# Altium footprint library Misc.PCBLIB: 128 footprints (part 8 of 8)
Each footprint in its own frame and in the unit in brackets; x right, y up, seen from the top. Pads: shape width x height; smd on the part's side, far side on the other; paste and mask are expansions set on the pad; w line width, h text height; cw(c..) or ccw(c..) is an arc to the next point about the centre after c.
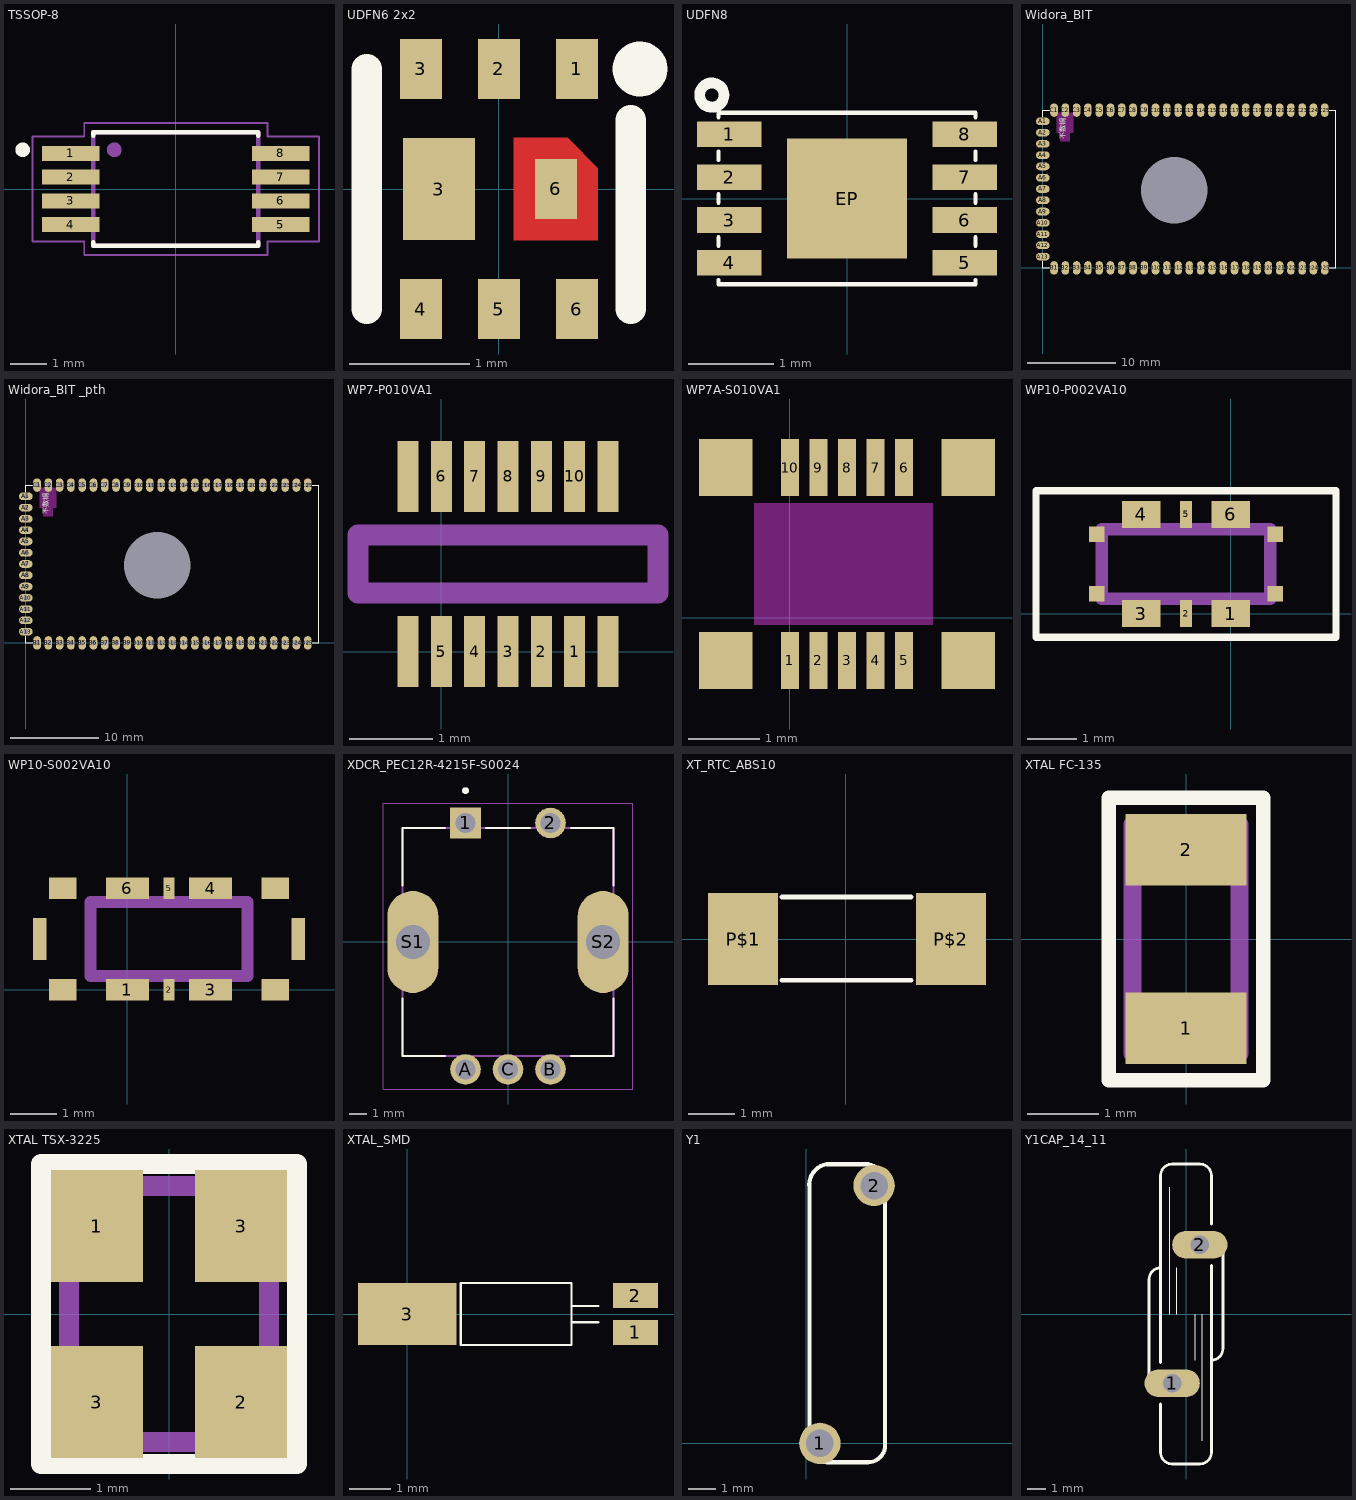
[diagram p7: the footprints below, top view; thin cyan lines are the x and y axes]

## TSSOP-8 [mm]
pads (8):
  rect 1.57x0.41 smd: 1(-2.87,0.975) 2(-2.87,0.325) 3(-2.87,-0.325) 4(-2.87,-0.975) 5(2.87,-0.975) 6(2.87,-0.325) 7(2.87,0.325) 8(2.87,0.975)
Top Overlay:
  circle w0.2: c-4.18,1.07 r0.1
  lines w0.127: -2.25,-1.45 -2.25,-1.55 2.25,-1.55 2.25,-1.45 ; -2.25,1.45 -2.25,1.55 2.25,1.55 2.25,1.45
Mechanical 1:
  circle w0.2: c-1.68,1.07 r0.1
  lines w0.127: -2.25,-1.55 -2.25,1.55 2.25,1.55 2.25,-1.55 -2.25,-1.55
Mechanical 4:
  lines w0.05: -3.91,-1.43 -3.91,1.43 -2.5,1.43 -2.5,1.8 2.5,1.8 2.5,1.43 3.91,1.43 3.91,-1.43 2.5,-1.43 2.5,-1.8 -2.5,-1.8 -2.5,-1.43 -3.91,-1.43
3D body "SW3dPS-TSSOP8-2.STEP": height 0.28, standoff -0.47, extent -1.5,-1 1.6,1

## UDFN6 2x2 [mm] "UDFN6 2x2, 0.65P  CASE 517BF"
height 0.55
pads (8):
  rect 0.35x0.5 smd: 1(0.65,1) 2(0,1) 3(-0.65,1) 4(-0.65,-1) 5(0,-1) 6(0.475,0.001) 6(0.65,-1)
  rect 0.6x0.85 smd: 3(-0.5,0)
Top Layer:
  region: 0.575,0.425 0.825,0.175 0.825,-0.425 0.125,-0.425 0.125,0.425
Top Overlay:
  circle w0.305: c1.175,1 r0.076
  lines w0.254: -1.1,-1 -1.1,1 ; 1.1,-1 1.1,0.575
Top Solder:
  region: 0.6,0.55 0.925,0.225 0.925,-0.525 0.025,-0.525 0.025,0.55
3D body: height 0.55, standoff 0, extent -1,-1 1,1

## UDFN8 [mil] "UDFN8 2x3, 0.65P  CASE 517BF"
height 21.65
pads (9):
  rect 29.53x11.81 smd: 1(-54.13,29.53) 2(-54.13,9.84) 3(-54.13,-9.84) 4(-54.13,-29.53) 5(54.13,-29.53) 6(54.13,-9.84) 7(54.13,9.84) 8(54.13,29.53)
  rect 55.12x55.12 smd: EP(0,0)
Top Overlay:
  circle w5: c-62.09,47.54 r5.57
  lines w1.97: -59.06,-37.4 -59.06,-39.37 59.06,-39.37 59.06,-37.4 ; -59.06,-21.65 -59.06,-17.72 ; -59.06,-1.97 -59.06,1.97 ; -59.06,17.72 -59.06,21.65 ; -59.06,37.4 -59.06,39.37 59.06,39.37 59.06,37.4 ; 59.06,-21.65 59.06,-17.72 ; 59.06,-1.97 59.06,1.97 ; 59.06,17.72 59.06,21.65
3D body: height 21.65, standoff 0, extent -59.37,-40 59.69,40

## Widora_BIT [mil] "Widora bit MT7688"
pads (64):
  oval 60x34 smd mask+2: A1(0,650) A2(0,600) A3(0,550) A4(0,500) A5(0,450) A6(0,400) A7(0,350) A8(0,300) A9(0,250) A10(0,200) A11(0,150) A12(0,100) A13(0,50)
  oval 34x60 smd mask+2: B1(50,0) B2(100,0) B3(150,0) B4(200,0) B5(250,0) B6(300,0) B7(350,0) B8(400,0) B9(450,0) B10(500,0) B11(550,0) B12(600,0) B13(650,0) B14(700,0) B15(750,0) B16(800,0) B17(850,0) B18(900,0) B19(950,0) B20(1000,0) B21(1050,0) B22(1100,0) B23(1150,0) B24(1200,0) B25(1250,0) C1(50,700) C2(100,700) C3(150,700) C4(200,700) C5(250,700) C6(300,700) C7(350,700) C8(400,700) C9(450,700) C10(500,700) C11(550,700) C12(600,700) C13(650,700) C14(700,700) C15(750,700) C16(800,700) C17(850,700) C18(900,700) C19(950,700) C20(1000,700) C21(1050,700) C22(1100,700) C23(1150,700) C24(1200,700) C25(1250,700)
  oval 31.5x47.24 hole 295.28: ""(583.11,345)
Top Overlay:
  lines w3.94: 0,30 0,0 30,0 ; 0,670 0,700 30,700 ; 1270,0 1300,0 1300,700 1270,700
  text "不敷铜" at 108,571 h40
Keep-Out Layer:
  pour cut-out: 61.39,686.97 61.39,600.32 77.09,600.32 77.09,560.97 120.44,560.97 120.44,600.32 136.19,600.32 136.19,686.97

## Widora_BIT _pth [mm] "Widora bit MT7688"
pads (64):
  oval 1.524x0.863 / inner round 1.524 / far side round 0.8 hole 0.55: A1(0,16.51) A2(0,15.24) A3(0,13.97) A4(0,12.7) A5(0,11.43) A6(0,10.16) A7(0,8.89) A8(0,7.62) A9(0,6.35) A10(0,5.08) A11(0,3.81) A12(0,2.54) A13(0,1.27)
  oval 0.863x1.524 / inner round 1.524 / far side round 0.8 hole 0.55: B1(1.27,0) B2(2.54,0) B3(3.81,0) B4(5.08,0) B5(6.35,0) B6(7.62,0) B7(8.89,0) B8(10.16,0) B9(11.43,0) B10(12.7,0) B11(13.97,0) B12(15.24,0) B13(16.51,0) B14(17.78,0) B15(19.05,0) B16(20.32,0) B17(21.59,0) B18(22.86,0) B19(24.13,0) B20(25.4,0) B21(26.67,0) B22(27.94,0) B23(29.21,0) B24(30.48,0) B25(31.75,0) C1(1.27,17.78) C2(2.54,17.78) C3(3.81,17.78) C4(5.08,17.78) C5(6.35,17.78) C6(7.62,17.78) C7(8.89,17.78) C8(10.16,17.78) C9(11.43,17.78) C10(12.7,17.78) C11(13.97,17.78) C12(15.24,17.78) C13(16.51,17.78) C14(17.78,17.78) C15(19.05,17.78) C16(20.32,17.78) C17(21.59,17.78) C18(22.86,17.78) C19(24.13,17.78) C20(25.4,17.78) C21(26.67,17.78) C22(27.94,17.78) C23(29.21,17.78) C24(30.48,17.78) C25(31.75,17.78)
  oval 0.8x1.2 hole 7.5: ""(14.811,8.763)
Top Overlay:
  lines w0.1: 0,0.762 0,0 0.762,0 ; 0,17.018 0,17.78 0.762,17.78 ; 32.258,0 33.02,0 33.02,17.78 32.258,17.78
  text "不敷铜" at 2.743,14.503 h1.02
Keep-Out Layer:
  pour cut-out: 1.559,17.449 1.559,15.248 1.958,15.248 1.958,14.249 3.059,14.249 3.059,15.248 3.459,15.248 3.459,17.449

## WP7-P010VA1 [mm]
pads (14):
  rect 0.25x0.85 smd: 1(1.6,0) 2(1.2,0) 3(0.8,0) 4(0.4,0) 5(0,0) 6(0,2.1) 7(0.4,2.1) 8(0.8,2.1) 9(1.2,2.1) 10(1.6,2.1) ""(-0.4,0) ""(-0.4,2.1) ""(2,0) ""(2,2.1)
Mechanical 4:
  lines w0.254: -1,0.7 -1,1.4 2.6,1.4 2.6,0.7 -1,0.7
3D body "K3D-WP7-P010VA1-V2_JAE_Proprietary.STEP": height 0.52, standoff 0, extent -0.9,0 2.5,2

## WP7A-S010VA1 [mm]
pads (14):
  rect 0.25x0.8 smd: 1(0,-0.6) 2(0.4,-0.6) 3(0.8,-0.6) 4(1.2,-0.6) 5(1.6,-0.6) 6(1.6,2.1) 7(1.2,2.1) 8(0.8,2.1) 9(0.4,2.1) 10(0,2.1)
  rect 0.75x0.8 smd: ""(-0.9,-0.6) ""(-0.9,2.1) ""(2.5,-0.6) ""(2.5,2.1)
Top Layer keep-out:
  region: 2,-0.1 -0.5,-0.1 -0.5,1.6 2,1.6
3D body "K3D-WP7A-S010VA1-V2_JAE_Proprietary.STEP": height 0.65, standoff -0.03, extent -1.5,-0.556 3.1,1.956

## WP10-P002VA10 [mm]
pads (10):
  rect 0.78x0.55 smd: 1(0,0) 3(-1.8,0) 4(-1.8,2) 6(0,2)
  rect 0.24x0.55 smd: 2(-0.9,0) 5(-0.9,2)
  rect 0.32x0.32 smd: ""(-2.7,0.4) ""(-2.7,1.6) ""(0.9,0.4) ""(0.9,1.6)
Top Overlay:
  lines w0.15: -3.925,-0.475 2.125,-0.475 2.125,2.475 -3.925,2.475 -3.925,-0.475
Mechanical 4:
  lines w0.254: -2.6,0.3 0.8,0.3 0.8,1.7 -2.6,1.7 -2.6,0.3
3D body "K3D-WP10-P002VA10-V1_JAE_Proprietary.STEP": height 0.59, standoff 0, extent -3.3,-0.075 1.5,2.075

## WP10-S002VA10 [mm]
pads (12):
  rect 0.93x0.475 smd: 1(0,0) 3(1.8,0) 4(1.8,2.2) 6(0,2.2)
  rect 0.24x0.475 smd: 2(0.9,0) 5(0.9,2.2)
  rect 0.3x0.9 smd: ""(-1.9,1.1) ""(3.7,1.1)
  rect 0.6x0.475 smd: ""(-1.4,0) ""(-1.4,2.2) ""(3.2,0) ""(3.2,2.2)
Mechanical 4:
  lines w0.254: -0.8,0.3 2.6,0.3 2.6,1.9 -0.8,1.9 -0.8,0.3
3D body "K3D-WP10-S002VA10-V1_JAE_Proprietary.STEP": height 0.7, standoff 0, extent -1.94,0 3.74,2.2

## XDCR_PEC12R-4215F-S0024 [mm]
height 15
pads (7):
  rect 1.8x1.8 / inner round 1.8 / far side rect 1.8x1.8 hole 1.2: 1(-2.5,7)
  round 1.8 hole 1.2: 2(2.5,7) A(-2.5,-7.5) B(2.5,-7.5) C(0,-7.5)
  oval 3x6 hole 2 square: S1(-5.6,0) S2(5.6,0)
Top Overlay:
  circle w0.2: c-2.5,8.9 r0.1
  lines w0.127: -6.2,-3.32 -6.2,-6.7 -3.72,-6.7 ; -6.2,3.32 -6.2,6.7 -3.72,6.7 ; -1.28,6.7 1.28,6.7 ; 3.72,-6.7 6.2,-6.7 6.2,-3.32 ; 3.72,6.7 6.2,6.7 6.2,3.32
Mechanical 13:
  circle w0.2: c-2.5,8.9 r0.1
  lines w0.127: -6.2,-6.7 -6.2,6.7 6.2,6.7 6.2,-6.7 -6.2,-6.7
Mechanical 15:
  lines w0.05: -7.35,-8.65 -7.35,8.15 7.35,8.15 7.35,-8.65 -7.35,-8.65

## XT_RTC_ABS10 [mil]
pads (2):
  rect 60x79 smd: P$1(-88.19,0) P$2(90,0)
Top Overlay:
  lines w4: -55.12,-35.43 56,-35.43 ; -55.12,36 56,36

## XTAL FC-135 [mm]
height 0.8
pads (2):
  rect 1.7x1 smd: 1(0,-1.25) 2(0,1.25)
Top Overlay:
  lines w0.203: -1.08,-1.98 -1.08,1.98 1.08,1.98 1.08,-1.98 -1.08,-1.98
Mechanical 1:
  lines w0.254: -0.75,-1.6 0.75,-1.6 0.75,1.6 -0.75,1.6 -0.75,-1.6

## XTAL TSX-3225 [mm]
height 0.6
pads (4):
  rect 1.15x1.4 smd: 1(-0.9,1.1) 2(0.9,-1.1) 3(-0.9,-1.1) 3(0.9,1.1)
Top Overlay:
  lines w0.254: -1.6,-1.875 1.6,-1.875 1.6,1.875 -1.6,1.875 -1.6,-1.875
Mechanical 1:
  lines w0.254: -1.25,-1.6 -1.25,1.6 1.25,1.6 1.25,-1.6 -1.25,-1.6

## XTAL_SMD [mil]
pads (3):
  rect 43.31x23.62 smd: 1(218.51,-17.72) 2(218.51,17.71)
  rect 94.49x59.06 smd: 3(0,0)
Top Overlay:
  lines w1.97: 183.08,-7.88 157.48,-7.88 ; 183.08,7.87 157.48,7.87 ; 157.48,-7.88 157.48,-29.53 51.19,-29.53 51.19,29.53 157.48,29.53 157.48,7.87 ; 157.48,-7.88 157.48,7.87
3D body "User Library-MS2V-T1S.STEP": height 57.87, standoff -1.18, extent -47.25,-31.49 236.22,27.56

## Y1 [mil]
pads (2):
  round 60 hole 40: 1(20,0) 2(99,375)
Top Overlay:
  lines w6: 5,-2.52 ccw(c30,-2.52) 30,-27.52 90,-27.52 ccw(c90,-2.52) 115,-2.52 115,372 ccw(c85.5,376.5) 90,406 30,406 ccw(c34.5,376.5) 5,372 5,-2.52

## Y1CAP_14_11 [mil]
pads (2):
  oval 120x60 hole 40: 1(-30,-150) 2(30,150)
Top Overlay:
  lines w2: -35,0 -35,275 ; -20,0 -20,100 ; 20,-100 20,0 ; 35,-275 35,0
  lines w6: -80,-145 -80,75 cw(c-55,75) -55,100 ; -55,-195 -55,-300 ccw(c-30,-300) -30,-325 30,-325 ccw(c30,-300) 55,-300 55,105 ; -55,-105 -55,300 cw(c-30,300) -30,325 30,325 cw(c30,300) 55,300 55,195 ; 55,-100 ccw(c55,-75) 80,-75 80,145